# Altium integrated library LED-THP_V2.IntLib: 218 symbols
Pins are listed as number, name and electrical type; pins without a type are passive.

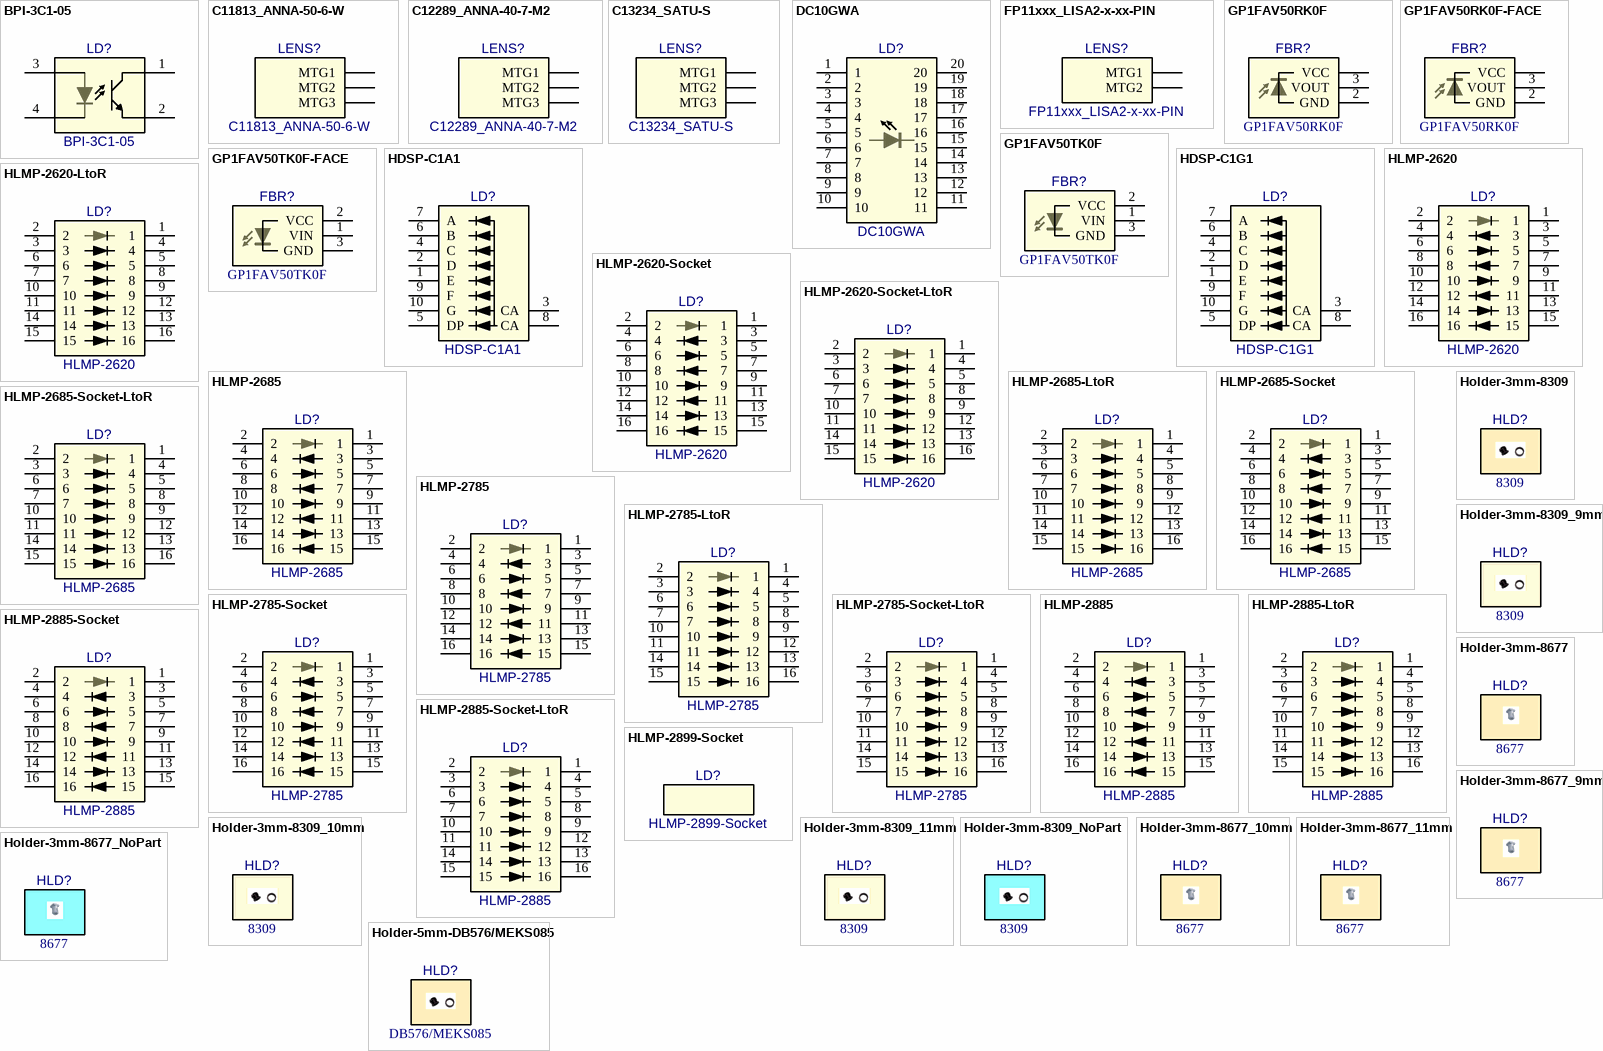
[diagram p0: symbols BPI-3C1-05 to Holder-5mm-DB576/MEKS085]

## BPI-3C1-05
designator LD?
Photo Interrupter; Manufacturer: Bright led; Part Number: BPI-3C1-05; Package: BPI-3C1-05; EDM-PN: *; SAAB PN: *; Value: BPI-3C1-05
footprint BPI-3C1-05 (New Pattern 0.0x0.0mm)
pins: 1 C, 2 E, 3 K, 4 A

## C11813_ANNA-50-6-W
designator LENS?
Led Lens Array; Manufacturer: LEDiL; Part Number: C11813_ANNA-50-6-W; Package: C11813_ANNA-50-6-W; EDM-PN: *; SAAB PN: *; Value: C11813_ANNA-50-6-W
footprint C11813_ANNA-50-6-W
pins: MTG1, MTG2, MTG3

## C12289_ANNA-40-7-M2
designator LENS?
Led Lens Array; Manufacturer: LEDiL; Part Number: C12289_ANNA-40-7-M2; Package: C12289_ANNA-40-7-M2; EDM-PN: *; SAAB PN: *; Value: C12289_ANNA-40-7-M2
footprint C12289_ANNA-40-7-M2
pins: MTG1, MTG2, MTG3

## C13234_SATU-S
designator LENS?
Led Lens Array; Manufacturer: LEDiL; Part Number: C13234_SATU-S; Package: C13234_SATU-S; EDM-PN: *; SAAB PN: *; Value: C13234_SATU-S
footprint C13234_SATU-S
pins: MTG1, MTG2, MTG3

## DC10GWA
designator LD?
LED Array 10 Segment Green; Manufacturer: Kingbright; Part Number: DC10GWA; Package: DIP-10SEG-DISPLAY; EDM-PN: *; SAAB PN: *; Value: DC10GWA
footprint DIP-10SEG-DISPLAY (DIP 10 Segment Array 10.16x24.5)
pins: 1, 2, 3, 4, 5, 6, 7, 8, 9, 10, 11, 12, 13, 14, 15, 16, 17, 18, 19, 20

## FP11xxx_LISA2-x-xx-PIN
designator LENS?
Led Lens; Manufacturer: LEDiL; Part Number: FP11xxx_LISA2-x-xx-PIN; Package: LISA2-FR11xxx; EDM-PN: *; SAAB PN: *; Value: FP11xxx_LISA2-x-xx-PIN
footprint LISA2-FR11xxx (LISA2-FR11xxx 10.0x10.0mm)
pins: 1 MTG1, 2 MTG2

## GP1FAV50RK0F
designator FBR?
Fiber Optic Receiver; Manufacturer: Sharp; Package: GP1FAV50xK0F; EDM-PN: *; Text1: *; Value: GP1FAV50RK0F; SAAB PN: *; Part Number: GP1FAV50RK0F
footprint GP1FAV50xK0F
pins: 1 VCC, 2 GND, 3 VOUT

## GP1FAV50RK0F-FACE
designator FBR?  Part Number: GP1FAV50RK0F  (hidden comment: GP1FAV50RK0F-FACE)
Fiber Optic Receiver; Manufacturer: Sharp; Package: GP1FAV50xK0F-FACE; EDM-PN: *; Text1: *; Value: GP1FAV50RK0F; SAAB PN: *
footprint GP1FAV50xK0F-FACE (GP1FAV50xK0F Face)
pins: 1 VCC, 2 GND, 3 VOUT

## GP1FAV50TK0F
designator FBR?
Fiber Optic Transmitter; Manufacturer: Sharp; Package: GP1FAV50xK0F; EDM-PN: *; Text1: *; Value: GP1FAV50TK0F; SAAB PN: *; Part Number: GP1FAV50TK0F
footprint GP1FAV50xK0F
pins: 1 VIN, 2 VCC, 3 GND

## GP1FAV50TK0F-FACE
designator FBR?  Part Number: GP1FAV50TK0F  (hidden comment: GP1FAV50TK0F-FACE)
Fiber Optic Transmitter; Manufacturer: Sharp; Package: GP1FAV50xK0F-FACE; EDM-PN: *; Text1: *; Value: GP1FAV50TK0F; SAAB PN: *
footprint GP1FAV50xK0F-FACE (GP1FAV50xK0F Face)
pins: 1 VIN, 2 VCC, 3 GND

## HDSP-C1A1
designator LD?
LED 7-Segment 1" AlGaAs Red; Manufacturer: Avago; Part Number: HDSP-C1A1; Package: HDSP-C1A1; EDM-PN: *; SAAB PN: *; Value: HDSP-C1A1
footprint HDSP-C1A1 (HDSP-C1A1 24.0x34.0mm)
pins: 1 E, 2 D, 3 CA, 4 C, 5 DP, 6 B, 7 A, 8 CA, 9 F, 10 G

## HDSP-C1G1
designator LD?
LED 7-Segment 1" Green; Manufacturer: Avago; Part Number: HDSP-C1G1; Package: HDSP-C1G1; EDM-PN: *; SAAB PN: *; Value: HDSP-C1G1
footprint HDSP-C1G1 (HDSP-C1G1 24.0x34.0mm)
pins: 1 E, 2 D, 3 CA, 4 C, 5 DP, 6 B, 7 A, 8 CA, 9 F, 10 G

## HLMP-2620
designator LD?
LED Light Bar (Red); Manufacturer: Avago; Part Number: HLMP-2620; Package: HLMP-2620; EDM-PN: *; SAAB PN: *; Value: HLMP-2620
footprint HLMP-2620 (HLMP-2620 10.16x20.32mm)
pins: 1, 2, 3, 4, 5, 6, 7, 8, 9, 10, 11, 12, 13, 14, 15, 16

## HLMP-2620-LtoR
designator LD?  value HLMP-2620  (hidden comment: HLMP-2620-LtoR)
LED Light Bar (Red); Manufacturer: Avago; Part Number: HLMP-2620; Package: HLMP-2620; EDM-PN: *; SAAB PN: *
footprint HLMP-2620 (HLMP-2620 10.16x20.32mm)
pins: 1, 2, 3, 4, 5, 6, 7, 8, 9, 10, 11, 12, 13, 14, 15, 16

## HLMP-2620-Socket
designator LD?  value HLMP-2620  (hidden comment: HLMP-2620-Socket)
LED Light Bar (Red) with 16Pin Socket; Manufacturer: Avago; Part Number: HLMP-2620; Package: HLMP-2620-SOCKET; EDM-PN: *; SAAB PN: *
footprint HLMP-2620-SOCKET (HLMP-2620 10.16x20.32mm)
pins: 1, 2, 3, 4, 5, 6, 7, 8, 9, 10, 11, 12, 13, 14, 15, 16

## HLMP-2620-Socket-LtoR
designator LD?  value HLMP-2620  (hidden comment: HLMP-2620-Socket-LtoR)
LED Light Bar (Red) with 16Pin Socket; Manufacturer: Avago; Part Number: HLMP-2620; Package: HLMP-2620-SOCKET; EDM-PN: *; SAAB PN: *
footprint HLMP-2620-SOCKET (HLMP-2620 10.16x20.32mm)
pins: 1, 2, 3, 4, 5, 6, 7, 8, 9, 10, 11, 12, 13, 14, 15, 16

## HLMP-2685
designator LD?
LED Light Bar (Red); Manufacturer: Avago; Part Number: HLMP-2685; Package: HLMP-2685; EDM-PN: *; SAAB PN: *; Value: HLMP-2685
footprint HLMP-2685 (HLMP-2685 10.16x20.32mm)
pins: 1, 2, 3, 4, 5, 6, 7, 8, 9, 10, 11, 12, 13, 14, 15, 16

## HLMP-2685-LtoR
designator LD?  value HLMP-2685  (hidden comment: HLMP-2685-LtoR)
LED Light Bar (Red); Manufacturer: Avago; Part Number: HLMP-2685; Package: HLMP-2685; EDM-PN: *; SAAB PN: *
footprint HLMP-2685 (HLMP-2685 10.16x20.32mm)
pins: 1, 2, 3, 4, 5, 6, 7, 8, 9, 10, 11, 12, 13, 14, 15, 16

## HLMP-2685-Socket
designator LD?  value HLMP-2685  (hidden comment: HLMP-2685-Socket)
LED Light Bar (Red) with 16Pin Socket; Manufacturer: Avago; Part Number: HLMP-2685; Package: HLMP-2685-SOCKET; EDM-PN: *; SAAB PN: *
footprint HLMP-2685-SOCKET (HLMP-2685 10.16x20.32mm)
pins: 1, 2, 3, 4, 5, 6, 7, 8, 9, 10, 11, 12, 13, 14, 15, 16

## HLMP-2685-Socket-LtoR
designator LD?  value HLMP-2685  (hidden comment: HLMP-2685-Socket-LtoR)
LED Light Bar (Red) with 16Pin Socket; Manufacturer: Avago; Part Number: HLMP-2685; Package: HLMP-2685-SOCKET; EDM-PN: *; SAAB PN: *
footprint HLMP-2685-SOCKET (HLMP-2685 10.16x20.32mm)
pins: 1, 2, 3, 4, 5, 6, 7, 8, 9, 10, 11, 12, 13, 14, 15, 16

## HLMP-2785
designator LD?
LED Light Bar (Yellow); Manufacturer: Avago; Part Number: HLMP-2785; Package: HLMP-2785; EDM-PN: *; SAAB PN: *; Value: HLMP-2785
footprint HLMP-2785 (HLMP-2785 10.16x20.32mm)
pins: 1, 2, 3, 4, 5, 6, 7, 8, 9, 10, 11, 12, 13, 14, 15, 16

## HLMP-2785-LtoR
designator LD?  value HLMP-2785  (hidden comment: HLMP-2785-LtoR)
LED Light Bar (Yellow); Manufacturer: Avago; Part Number: HLMP-2785; Package: HLMP-2785; EDM-PN: *; SAAB PN: *
footprint HLMP-2785 (HLMP-2785 10.16x20.32mm)
pins: 1, 2, 3, 4, 5, 6, 7, 8, 9, 10, 11, 12, 13, 14, 15, 16

## HLMP-2785-Socket
designator LD?  value HLMP-2785  (hidden comment: HLMP-2785-Socket)
LED Light Bar (Yellow) with 16Pin Socket; Manufacturer: Avago; Part Number: HLMP-2785 & Socket; Package: HLMP-2785-SOCKET; EDM-PN: *; SAAB PN: *
footprint HLMP-2785-SOCKET (HLMP-2785 10.16x20.32mm)
pins: 1, 2, 3, 4, 5, 6, 7, 8, 9, 10, 11, 12, 13, 14, 15, 16

## HLMP-2785-Socket-LtoR
designator LD?  value HLMP-2785  (hidden comment: HLMP-2785-Socket-LtoR)
LED Light Bar (Yellow) with 16Pin Socket; Manufacturer: Avago; Part Number: HLMP-2785 & Socket; Package: HLMP-2785-SOCKET; EDM-PN: *; SAAB PN: *
footprint HLMP-2785-SOCKET (HLMP-2785 10.16x20.32mm)
pins: 1, 2, 3, 4, 5, 6, 7, 8, 9, 10, 11, 12, 13, 14, 15, 16

## HLMP-2885
designator LD?
LED Light Bar (Green); Manufacturer: Avago; Part Number: HLMP-2885; Package: HLMP-2885; EDM-PN: *; SAAB PN: *; Value: HLMP-2885
footprint HLMP-2885 (HLMP-2885 10.16x20.32mm)
pins: 1, 2, 3, 4, 5, 6, 7, 8, 9, 10, 11, 12, 13, 14, 15, 16

## HLMP-2885-LtoR
designator LD?  value HLMP-2885  (hidden comment: HLMP-2885-LtoR)
LED Light Bar (Green); Manufacturer: Avago; Part Number: HLMP-2885; Package: HLMP-2885; EDM-PN: *; SAAB PN: *
footprint HLMP-2885 (HLMP-2885 10.16x20.32mm)
pins: 1, 2, 3, 4, 5, 6, 7, 8, 9, 10, 11, 12, 13, 14, 15, 16

## HLMP-2885-Socket
designator LD?  value HLMP-2885  (hidden comment: HLMP-2885-Socket)
LED Light Bar (Green) with 16Pin Socket; Manufacturer: Avago; Part Number: HLMP-2885 & Socket; Package: HLMP-2885-SOCKET; EDM-PN: *; SAAB PN: *
footprint HLMP-2885-SOCKET (HLMP-2885 10.16x20.32mm)
pins: 1, 2, 3, 4, 5, 6, 7, 8, 9, 10, 11, 12, 13, 14, 15, 16

## HLMP-2885-Socket-LtoR
designator LD?  value HLMP-2885  (hidden comment: HLMP-2885-Socket-LtoR)
LED Light Bar (Green) with 16Pin Socket; Manufacturer: Avago; Part Number: HLMP-2885 & Socket; Package: HLMP-2885-SOCKET; EDM-PN: *; SAAB PN: *
footprint HLMP-2885-SOCKET (HLMP-2885 10.16x20.32mm)
pins: 1, 2, 3, 4, 5, 6, 7, 8, 9, 10, 11, 12, 13, 14, 15, 16

## HLMP-2899-Socket
designator LD?
LED Light Bar Bezel (HLMP-2x85); Manufacturer: Agilent; Part Number: HLMP-2899; Package: HLMP-2899-Socket; EDM-PN: *; SAAB PN: *; Value: HLMP-2899-Socket
footprint HLMP-2899-SOCKET (HLMP-2899 23.88x3.72mm)

## Holder-3mm-8309
designator HLD?, comment 8309
Led Holder Clip-in 3mm; Manufacturer: Keystone; Package: HOLDER-3MM-8309; EDM-PN: *; Text1: *; Value: 8309; SAAB PN: *; Part Number: 8309
footprint HOLDER-3MM-8309 (8309 5.9x5.9mm)

## Holder-3mm-8309_9mm
designator HLD?, comment 8309
Led Holder Clip-in 3mm; Manufacturer: Keystone; Package: HOLDER-3MM-8309-9mm; EDM-PN: *; Text1: *; Value: 8309; SAAB PN: *; Part Number: 8309
footprint HOLDER-3MM-8309-9mm (8309 5.9x5.9mm)

## Holder-3mm-8309_10mm
designator HLD?, comment 8309
Led Holder Clip-in 3mm; Manufacturer: Keystone; Package: HOLDER-3MM-8309-10mm; EDM-PN: *; Text1: *; Value: 8309; SAAB PN: *; Part Number: 8309
footprint HOLDER-3MM-8309-10mm (8309 5.9x5.9mm)

## Holder-3mm-8309_11mm
designator HLD?, comment 8309
Led Holder Clip-in 3mm; Manufacturer: Keystone; Package: HOLDER-3MM-8309-11mm; EDM-PN: *; Text1: *; Value: 8309; SAAB PN: *; Part Number: 8309
footprint HOLDER-3MM-8309-11mm (8309 5.9x5.9mm)

## Holder-3mm-8309_NoPart
designator HLD?, comment 8309  (mechanical)
Led Holder Clip-in 3mm; Manufacturer: Keystone; Package: NA; EDM-PN: *; Text1: *; Value: 8309; SAAB PN: *; Part Number: 8309

## Holder-3mm-8677
designator HLD?, comment 8677
Led Lens Cap Clip-in 3mm; Manufacturer: Keystone; EDM-PN: MEC381; Package: HOLDER-3MM-8677; Text1: *; Value: 8677; SAAB PN: *; Part Number: 8677
footprint HOLDER-3MM-8677 (8677 4.8x4.8mm)

## Holder-3mm-8677_9mm
designator HLD?, comment 8677
Led Lens Cap Clip-in 3mm; Manufacturer: Keystone; EDM-PN: MEC381; Package: HOLDER-3MM-8677-9mm; Text1: *; Value: 8677; SAAB PN: *; Part Number: 8677
footprint HOLDER-3MM-8677-9mm (8677 4.8x4.8mm)

## Holder-3mm-8677_10mm
designator HLD?, comment 8677
Led Lens Cap Clip-in 3mm; Manufacturer: Keystone; EDM-PN: MEC381; Package: HOLDER-3MM-8677-10mm; Text1: *; Value: 8677; SAAB PN: *; Part Number: 8677
footprint HOLDER-3MM-8677-10mm (8677 4.8x4.8mm)

## Holder-3mm-8677_11mm
designator HLD?, comment 8677
Led Lens Cap Clip-in 3mm; Manufacturer: Keystone; EDM-PN: MEC381; Package: HOLDER-3MM-8677-11mm; Text1: *; Value: 8677; SAAB PN: *; Part Number: 8677
footprint HOLDER-3MM-8677-11mm (8677 4.8x4.8mm)

## Holder-3mm-8677_NoPart
designator HLD?, comment 8677  (mechanical)
Led Lens Cap Clip-in 3mm; Manufacturer: Keystone; EDM-PN: MEC381; Package: NA; Text1: *; Value: 8677; SAAB PN: *; Part Number: 8677

## Holder-5mm-DB576/MEKS085
designator HLD?, comment DB576/MEKS085
Led Holder Clip-in 5mm; Manufacturer: Ele123; EDM-PN: HLD19; Package: HOLDER-5MM-DB576/MEKS085; Text1: *; Value: DB576/MEKS085; SAAB PN: *; Part Number: DB576/MEKS085
footprint HOLDER-5MM-DB576/MEKS085 (DB576/MEKS085 7.6x7.6mm)

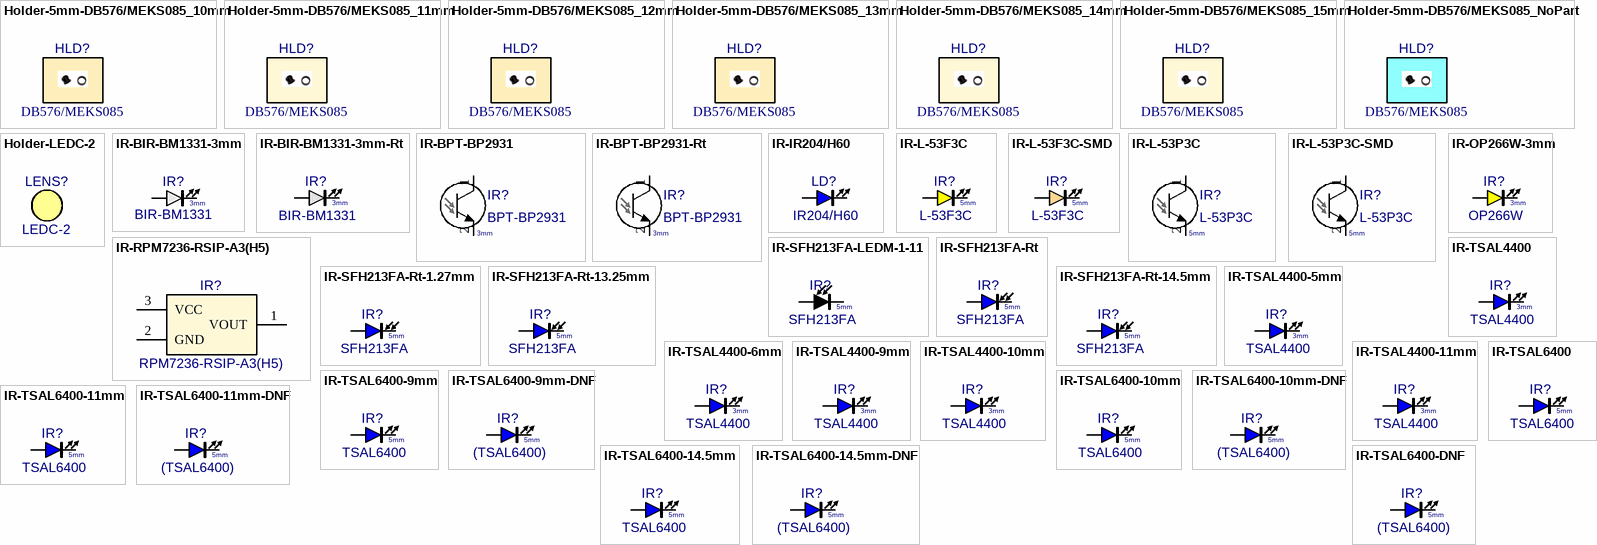
[diagram p1: symbols Holder-5mm-DB576/MEKS085_10mm to IR-TSAL6400-DNF]

## Holder-5mm-DB576/MEKS085_10mm
designator HLD?, comment DB576/MEKS085
Led Holder Clip-in 5mm; Manufacturer: Ele123; EDM-PN: HLD19; Package: HOLDER-5MM-DB576/MEKS085-10MM; Text1: *; Value: DB576/MEKS085; SAAB PN: *; Part Number: DB576/MEKS085
footprint HOLDER-5MM-DB576/MEKS085-10MM (DB576/MEKS085 7.6x7.6mm)

## Holder-5mm-DB576/MEKS085_11mm
designator HLD?, comment DB576/MEKS085
Led Holder Clip-in 5mm; Manufacturer: Ele123; EDM-PN: HLD19; Package: HOLDER-5MM-DB576/MEKS085-11MM; Text1: *; Value: DB576/MEKS085; SAAB PN: *; Part Number: DB576/MEKS085
footprint HOLDER-5MM-DB576/MEKS085-11MM (DB576/MEKS085 7.6x7.6mm)

## Holder-5mm-DB576/MEKS085_12mm
designator HLD?, comment DB576/MEKS085
Led Holder Clip-in 5mm; Manufacturer: Ele123; EDM-PN: HLD19; Package: HOLDER-5MM-DB576/MEKS085-12MM; Text1: *; Value: DB576/MEKS085; SAAB PN: *; Part Number: DB576/MEKS085
footprint HOLDER-5MM-DB576/MEKS085-12MM (DB576/MEKS085 7.6x7.6mm)

## Holder-5mm-DB576/MEKS085_13mm
designator HLD?, comment DB576/MEKS085
Led Holder Clip-in 5mm; Manufacturer: Ele123; EDM-PN: HLD19; Package: HOLDER-5MM-DB576/MEKS085-13MM; Text1: *; Value: DB576/MEKS085; SAAB PN: *; Part Number: DB576/MEKS085
footprint HOLDER-5MM-DB576/MEKS085-13MM (DB576/MEKS085 7.6x7.6mm)

## Holder-5mm-DB576/MEKS085_14mm
designator HLD?, comment DB576/MEKS085
Led Holder Clip-in 5mm; Manufacturer: Ele123; EDM-PN: HLD19; Package: HOLDER-5MM-DB576/MEKS085-14MM; Text1: *; Value: DB576/MEKS085; SAAB PN: *; Part Number: DB576/MEKS085
footprint HOLDER-5MM-DB576/MEKS085-14MM (DB576/MEKS085 7.6x7.6mm)

## Holder-5mm-DB576/MEKS085_15mm
designator HLD?, comment DB576/MEKS085
Led Holder Clip-in 5mm; Manufacturer: Ele123; EDM-PN: HLD19; Package: HOLDER-5MM-DB576/MEKS085-15MM; Text1: *; Value: DB576/MEKS085; SAAB PN: *; Part Number: DB576/MEKS085
footprint HOLDER-5MM-DB576/MEKS085-15MM (DB576/MEKS085 7.6x7.6mm)

## Holder-5mm-DB576/MEKS085_NoPart
designator HLD?, comment DB576/MEKS085  (mechanical)
Led Holder Clip-in 5mm; Manufacturer: Ele123; EDM-PN: HLD19; Package: NA; Text1: *; Value: DB576/MEKS085; SAAB PN: *; Part Number: DB576/MEKS085

## Holder-LEDC-2
designator LENS?, comment LEDC-2
Led Lens Holder (5mm); Manufacturer: Essentra; Part Number: LEDC-2; Package: HOLDER-LEDC-2; EDM-PN: *; SAAB PN: *; Value: LEDC-2
footprint HOLDER-LEDC-2 (LEDC-2 11.0x11.0mm)

## IR-BIR-BM1331-3mm
designator IR?  value BIR-BM1331  Text1: 3mm  (hidden comment: IR-BIR-BM1331-3mm)
IR Emitting Diode 3mm; Manufacturer: Bright Led Electronics; Part Number: BIR-BM1331; Package: LED-3mm-Clear; EDM-PN: *; SAAB PN: *
footprint LED-3mm-Clear (LED 3mm 4.0x4.0mm Clear)
pins: 1 K, 2 A

## IR-BIR-BM1331-3mm-Rt
designator IR?, comment value BIR-BM1331  Text1: 3mm  (hidden comment: IR-BIR-BM1331-3mm)
IR Emitting Diode 3mm; Manufacturer: Bright Led Electronics; Part Number: BIR-BM1331; Package: LED-3mm-Clear-Rt; EDM-PN: *; SAAB PN: *
footprint LED-3mm-Clear-Rt (LED 3mm R Angle 4.0x4.0mm Clear)
pins: 1 K, 2 A

## IR-BPT-BP2931
designator IR?  value BPT-BP2931  Text1: 3mm  (hidden comment: IR-BPT-BP2931)
IR Phototransistor 3mm; Manufacturer: Bright Led Electronics; Part Number: BPT-BP2931; Package: LED-3mm-Black; EDM-PN: *; SAAB PN: *
footprint LED-3mm-Black (LED 3mm 4.0x4.0mm Black)
pins: 1 K, 2 A

## IR-BPT-BP2931-Rt
designator IR?  value BPT-BP2931  Text1: 3mm  (hidden comment: IR-BPT-BP2931-Rt)
IR Phototransistor 3mm; Manufacturer: Bright Led Electronics; Part Number: BPT-BP2931; Package: LED-3mm-Black-Rt; EDM-PN: *; SAAB PN: *
footprint LED-3mm-Black-Rt (LED 3mm R Angle 4.0x4.0mm Black)
pins: 1 K, 2 A

## IR-IR204/H60
designator LD?, comment IR204/H60
IR Emitting Diode 3mm; Manufacturer: Everlight; Part Number: IR204/H60; Package: LED-3mm-Blue; EDM-PN: *; Text1: *; SAAB PN: *; Value: IR204/H60
footprint LED-3mm-Blue (LED 3mm 4.0x4.0mm Blue)
pins: 1 K, 2 A

## IR-L-53F3C
designator IR?  value L-53F3C  Text1: 5mm  (hidden comment: IR-L-53F3C)
IR Emitting Diode 5mm; Manufacturer: Kingbright; Part Number: L-53F3C; Package: LED-5mm-Yellow; EDM-PN: *; SAAB PN: *
footprint LED-5mm-Yellow (LED 5mm 5.9x5.5mm)
pins: 1 K, 2 A

## IR-L-53F3C-SMD
designator IR?  value L-53F3C  Text1: 5mm  (hidden comment: IR-L-53F3C-SMD)
IR Emitting Diode 5mm; Manufacturer: Kingbright; Part Number: L-53F3C; Package: LED-5mm-Orange-SMD; EDM-PN: *; SAAB PN: *
footprint LED-5mm-Orange-SMD (LED 5mm 5.9x5.5mm)
pins: 1 K, 2 A

## IR-L-53P3C
designator IR?  value L-53P3C  Text1: 5mm  (hidden comment: IR-L-53P3C)
IR Phototransistor 5mm; Manufacturer: Kingbright; Part Number: L-53P3C; Package: LED-5mm-Yellow; EDM-PN: *; SAAB PN: *
footprint LED-5mm-Yellow (LED 5mm 5.9x5.5mm)
pins: 1 K, 2 A

## IR-L-53P3C-SMD
designator IR?  value L-53P3C  Text1: 5mm  (hidden comment: IR-L-53P3C-SMD)
IR Phototransistor 5mm; Manufacturer: Kingbright; Part Number: L-53P3C; Package: LED-5mm-Orange-SMD; EDM-PN: *; SAAB PN: *
footprint LED-5mm-Orange-SMD (LED 5mm 5.9x5.5mm)
pins: 1 K, 2 A

## IR-OP266W-3mm
designator IR?  value OP266W  Text1: 3mm  (hidden comment: IR-OP266W-3mm)
IR Emitting Diode 3mm; Manufacturer: TT Electronics; Part Number: OP266W; Package: LED-3mm-Yellow; EDM-PN: *; SAAB PN: *
footprint LED-3mm-Yellow (LED 3mm 4.0x4.0mm Yellow)
pins: 1 K, 2 A

## IR-RPM7236-RSIP-A3(H5)
designator IR?  value RPM7236-RSIP-A3(H5)  (hidden comment: IR-RPM7236-RSIP-A3(H5))
IR Receiver Module; Manufacturer: Rohm; Part Number: RPM7236-RSIP-A3(H5); Package: RSIP-A3(H5); EDM-PN: *; Text1: *; SAAB PN: *
footprint RSIP-A3(H5)
pins: 1 VOUT, 2 GND (power), 3 VCC (power)

## IR-SFH213FA-LEDM-1-11
designator IR?, comment value SFH213FA  Text1: 5mm  (hidden comment: SFH213FA-LEDM-1-11)
IR Photodiode and Spacer; Manufacturer: Osram/Essentra; Part Number: SFH213FA/LEDM-1-11; Package: LED-5mm-Blue-LEDM-1-11; EDM-PN: *; SAAB PN: *
footprint LED-5mm-Blue-LEDM-1-11 (LED 5mm 5.9x5.5mm)
pins: 1 K, 2 A

## IR-SFH213FA-Rt
designator IR?, comment Text1: 5mm  (hidden comment: SFH213FA)
IR Photodiode; Manufacturer: Osram; Part Number: SFH213FA; Package: LED-5mm-Blue-Rt; EDM-PN: *; SAAB PN: *; Value: SFH213FA
footprint LED-5mm-BLUE-Rt (LED 5mm BLUE Rt Angle)
pins: 1 K, 2 A

## IR-SFH213FA-Rt-1.27mm
designator IR?, comment value SFH213FA  Text1: 5mm  (hidden comment: SFH213FA-1.27mm)
IR Photodiode; Manufacturer: Osram; Part Number: SFH213FA; Package: LED-5mm-Blue-Rt-1.27mm; EDM-PN: *; SAAB PN: *
footprint LED-5mm-BLUE-Rt-1.27mm (LED 5mm Blue Rt - Centre 1.27mm From PCB)
pins: 1 K, 2 A

## IR-SFH213FA-Rt-13.25mm
designator IR?, comment value SFH213FA  Text1: 5mm  (hidden comment: SFH213FA-13.25mm)
IR Photodiode; Manufacturer: Osram; Part Number: SFH213FA; Package: LED-5mm-Blue-Rt-13.25mm; EDM-PN: *; SAAB PN: *
footprint LED-5mm-BLUE-Rt-13.25mm (LED 5mm Blue Rt - Centre 13.25mm From PCB)
pins: 1 K, 2 A

## IR-SFH213FA-Rt-14.5mm
designator IR?, comment value SFH213FA  Text1: 5mm  (hidden comment: SFH213FA-14.5mm)
IR Photodiode; Manufacturer: Osram; Part Number: SFH213FA; Package: LED-5mm-Blue-Rt-14.5mm; EDM-PN: *; SAAB PN: *
footprint LED-5mm-BLUE-Rt-14.5mm (LED 5mm Blue Rt - Centre 14.5mm From PCB)
pins: 1 K, 2 A

## IR-TSAL4400
designator IR?, comment Text1: 3mm  (hidden comment: TSAL4400)
IR Emitting Diode 940nm 50Deg.; Manufacturer: Vishay; EDM-PN: LED234; Part Number: TSAL4400; Package: LED-3mm-Blue; SAAB PN: *; Value: TSAL4400
footprint LED-3mm-Blue (LED 3mm 4.0x4.0mm Blue)
pins: 1 K, 2 A

## IR-TSAL4400-5mm
designator IR?, comment value TSAL4400  Text1: 3mm  (hidden comment: TSAL4400/705820050)
IR Emitting Diode 940nm 50Deg. and Spacer; Manufacturer: Vishay/Wurth; EDM-PN: LED234/MEC380; Part Number: TSAL4400/705820050; Package: LED-3mm-Blue-5mm; SAAB PN: *
footprint LED-3mm-Blue-5mm (LED 3mm 4.0x4.0mm Blue)
pins: 1 K, 2 A

## IR-TSAL4400-6mm
designator IR?, comment value TSAL4400  Text1: 3mm  (hidden comment: TSAL4400/705820060)
IR Emitting Diode 940nm 50Deg. and Spacer; Manufacturer: Vishay/Wurth; EDM-PN: LED234/MEC?; Part Number: TSAL4400/705820060; Package: LED-3mm-Blue-6mm; SAAB PN: *
footprint LED-3mm-Blue-6mm (LED 3mm 4.0x4.0mm Blue)
pins: 1 K, 2 A

## IR-TSAL4400-9mm
designator IR?, comment value TSAL4400  Text1: 3mm  (hidden comment: TSAL4400/705820090)
IR Emitting Diode 940nm 50Deg. and Spacer; Manufacturer: Vishay/Wurth; EDM-PN: LED234/MEC338; Part Number: TSAL4400/705820090; Package: LED-3mm-Blue-9mm; SAAB PN: *
footprint LED-3mm-Blue-9mm (LED 3mm 4.0x4.0mm Blue)
pins: 1 K, 2 A

## IR-TSAL4400-10mm
designator IR?, comment value TSAL4400  Text1: 3mm  (hidden comment: TSAL4400/705820100)
IR Emitting Diode 940nm 50Deg. and Spacer; Manufacturer: Vishay/Wurth; EDM-PN: LED234/MEC363; Part Number: TSAL4400/705820100; Package: LED-3mm-Blue-10mm; SAAB PN: *
footprint LED-3mm-Blue-10mm (LED 3mm 4.0x4.0mm Blue)
pins: 1 K, 2 A

## IR-TSAL4400-11mm
designator IR?, comment value TSAL4400  Text1: 3mm  (hidden comment: TSAL4400/705820110)
IR Emitting Diode 940nm 50Deg. and Spacer; Manufacturer: Vishay/Wurth; EDM-PN: LED234/MEC362; Part Number: TSAL4400/705820110; Package: LED-3mm-Blue-11mm; SAAB PN: *
footprint LED-3mm-Blue-11mm (LED 3mm 4.0x4.0mm Blue)
pins: 1 K, 2 A

## IR-TSAL6400
designator IR?, comment Text1: 5mm  (hidden comment: TSAL6400)
IR Emitting Diode 940nm 50Deg.; Manufacturer: Vishay; EDM-PN: LED187; Part Number: TSAL6400; Package: LED-5mm-Blue; SAAB PN: *; Value: TSAL6400
footprint LED-5mm-Blue (LED 5mm 5.9x5.5mm)
pins: 1 K, 2 A

## IR-TSAL6400-9mm
designator IR?, comment value TSAL6400  Text1: 5mm  (hidden comment: TSAL6400/705820090)
IR Emitting Diode 940nm 50Deg. and Spacer; Manufacturer: Vishay/Wurth; EDM-PN: LED187/MEC338; Part Number: TSAL6400/705820090; Package: LED-5mm-Blue-9MM; SAAB PN: *
footprint LED-5mm-Blue-9MM (LED 5mm 5.9x5.5mm)
pins: 1 K, 2 A

## IR-TSAL6400-9mm-DNF
designator IR?, comment value (TSAL6400)  Text1: 5mm  (hidden comment: TSAL6400/705820090)
IR Emitting Diode 940nm 50Deg. and Spacer - Do not Fit; Manufacturer: Vishay/Wurth; Part Number: DNF - TSAL6400/705820090; EDM-PN: LED187/MEC338; Package: LED-5mm-Blue-9MM; SAAB PN: *
footprint LED-5mm-Blue-9MM (LED 5mm 5.9x5.5mm)
pins: 1 K, 2 A

## IR-TSAL6400-10mm
designator IR?, comment value TSAL6400  Text1: 5mm  (hidden comment: TSAL6400/705820100)
IR Emitting Diode 940nm 50Deg. and Spacer; Manufacturer: Vishay/Wurth; EDM-PN: LED187/MEC363; Part Number: TSAL6400/705820100; Package: LED-5mm-Blue-10MM; SAAB PN: *
footprint LED-5mm-Blue-10MM (LED 5mm 5.9x5.5mm)
pins: 1 K, 2 A

## IR-TSAL6400-10mm-DNF
designator IR?, comment value (TSAL6400)  Text1: 5mm  (hidden comment: TSAL6400/705820100)
IR Emitting Diode 940nm 50Deg. and Spacer - Do not Fit; Manufacturer: Vishay/Wurth; Part Number: DNF - TSAL6400/705820100; EDM-PN: LED187/MEC363; Package: LED-5mm-Blue-10MM; SAAB PN: *
footprint LED-5mm-Blue-10MM (LED 5mm 5.9x5.5mm)
pins: 1 K, 2 A

## IR-TSAL6400-11mm
designator IR?, comment value TSAL6400  Text1: 5mm  (hidden comment: TSAL6400/705820110)
IR Emitting Diode 940nm 50Deg. and Spacer; Manufacturer: Vishay/Wurth; EDM-PN: LED187/MEC362; Part Number: TSAL6400/705820110; Package: LED-5mm-Blue-11MM; SAAB PN: *
footprint LED-5mm-Blue-11MM (LED 5mm 5.9x5.5mm)
pins: 1 K, 2 A

## IR-TSAL6400-11mm-DNF
designator IR?, comment value (TSAL6400)  Text1: 5mm  (hidden comment: TSAL6400/705820110)
IR Emitting Diode 940nm 50Deg. and Spacer - Do not Fit; Manufacturer: Vishay/Wurth; Part Number: DNF - TSAL6400/705820110; EDM-PN: LED187/MEC362; Package: LED-5mm-Blue-11MM; SAAB PN: *
footprint LED-5mm-Blue-11MM (LED 5mm 5.9x5.5mm)
pins: 1 K, 2 A

## IR-TSAL6400-14.5mm
designator IR?, comment value TSAL6400  Text1: 5mm  (hidden comment: TSAL6400/705820145)
IR Emitting Diode 940nm 50Deg. and Spacer; Manufacturer: Vishay/Wurth; EDM-PN: LED187/MEC367; Part Number: TSAL6400/705820145; Package: LED-5mm-Blue-14.5MM; SAAB PN: *
footprint LED-5mm-Blue-14.5MM (LED 5mm 5.9x5.5mm)
pins: 1 K, 2 A

## IR-TSAL6400-14.5mm-DNF
designator IR?, comment value (TSAL6400)  Text1: 5mm  (hidden comment: TSAL6400/705820145)
IR Emitting Diode 940nm 50Deg. and Spacer - Do not Fit; Manufacturer: Vishay/Wurth; Part Number: DNF - TSAL6400/705820145; EDM-PN: LED187/MEC367; Package: LED-5mm-Blue-14.5MM; SAAB PN: *
footprint LED-5mm-Blue-14.5MM (LED 5mm 5.9x5.5mm)
pins: 1 K, 2 A

## IR-TSAL6400-DNF
designator IR?, comment value (TSAL6400)  Text1: 5mm  (hidden comment: TSAL6400)
IR Emitting Diode 940nm 50Deg. - Do not Fit; Manufacturer: Vishay; Part Number: DNF - TSAL6400; EDM-PN: LED187; Package: LED-5mm-Blue; SAAB PN: *
footprint LED-5mm-Blue (LED 5mm 5.9x5.5mm)
pins: 1 K, 2 A

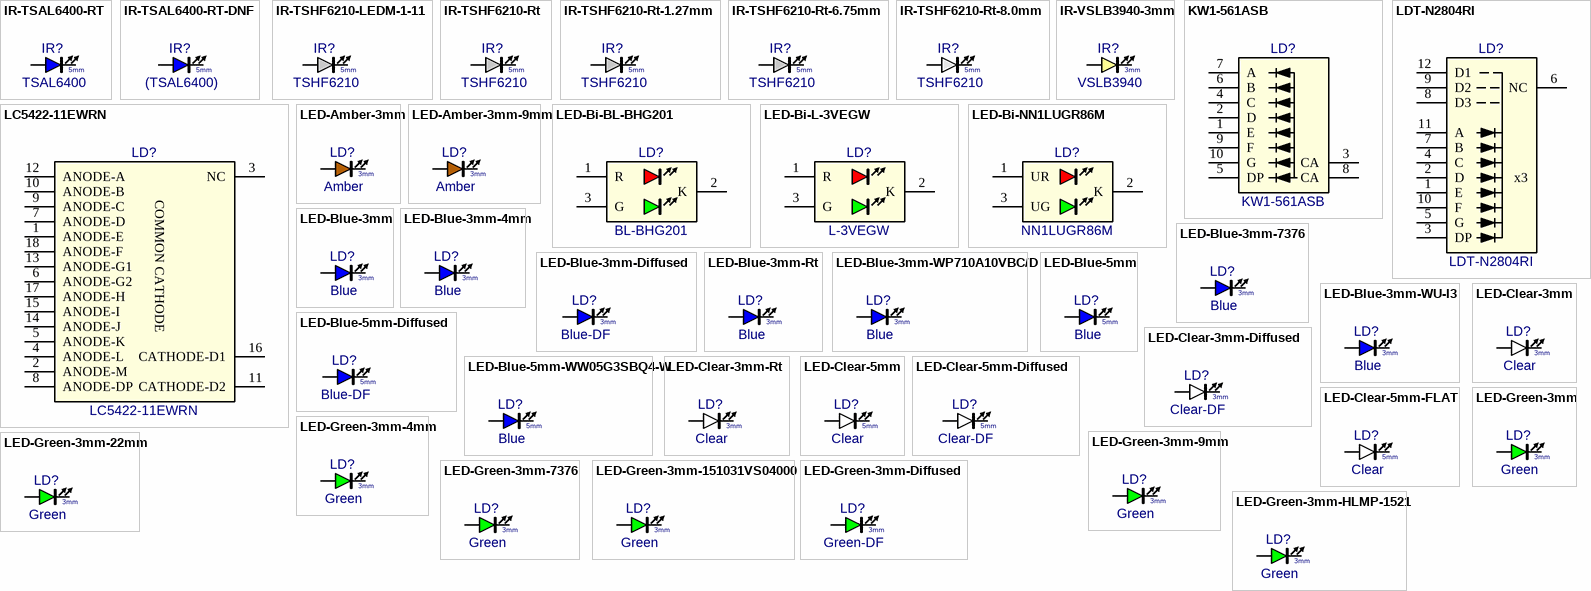
[diagram p2: symbols IR-TSAL6400-RT to LED-Green-3mm-HLMP-1521]

## IR-TSAL6400-RT
designator IR?, comment Text1: 5mm  (hidden comment: TSAL6400)
IR Emitting Diode 940nm 50Deg.; Manufacturer: Vishay; EDM-PN: LED187; Part Number: TSAL6400; Package: LED-5mm-Blue-RT; SAAB PN: *; Value: TSAL6400
footprint LED-5mm-Blue-RT (LED 5mm BLUE Rt Angle)
pins: 1 K, 2 A

## IR-TSAL6400-RT-DNF
designator IR?, comment value (TSAL6400)  Text1: 5mm  (hidden comment: TSAL6400)
IR Emitting Diode 940nm 50Deg. - Do not Fit; Manufacturer: Vishay; Part Number: DNF - TSAL6400; EDM-PN: LED187; Package: LED-5mm-Blue-RT; SAAB PN: *
footprint LED-5mm-Blue-RT (LED 5mm BLUE Rt Angle)
pins: 1 K, 2 A

## IR-TSHF6210-LEDM-1-11
designator IR?, comment value TSHF6210  Text1: 5mm  (hidden comment: TSHF6210-LEDM-1-11)
IR Emitting Diode and Spacer; Manufacturer: Vishay/Essentra; Part Number: TSHF6210/LEDM-1-11; Package: LED-5mm-White-LEDM-1-11; EDM-PN: *; SAAB PN: *
footprint LED-5mm-White-LEDM-1-11 (LED 5mm 5.9x5.5mm)
pins: 1 K, 2 A

## IR-TSHF6210-Rt
designator IR?, comment value TSHF6210  Text1: 5mm  (hidden comment: TSHF6210-RT)
IR Emitting Diode; Manufacturer: Vishay; Part Number: TSHF6210; Package: LED-5mm-White-RT; EDM-PN: *; SAAB PN: *
footprint LED-5mm-WHITE-Rt (LED 5mm White Rt)
pins: 1 K, 2 A

## IR-TSHF6210-Rt-1.27mm
designator IR?, comment value TSHF6210  Text1: 5mm  (hidden comment: TSHF6210-RT-1.27mm)
IR Emitting Diode; Manufacturer: Vishay; Part Number: TSHF6210; Package: LED-5mm-White-RT-1.27mm; EDM-PN: *; SAAB PN: *
footprint LED-5mm-WHITE-Rt-1.27mm (LED 5mm White Rt - Centre 1.27mm From PCB)
pins: 1 K, 2 A

## IR-TSHF6210-Rt-6.75mm
designator IR?, comment value TSHF6210  Text1: 5mm  (hidden comment: TSHF6210-RT-6.75mm)
IR Emitting Diode; Manufacturer: Vishay; Part Number: TSHF6210; Package: LED-5mm-White-RT-6.75mm; EDM-PN: *; SAAB PN: *
footprint LED-5mm-WHITE-Rt-6.75mm (LED 5mm White Rt - Centre 6.75mm From PCB)
pins: 1 K, 2 A

## IR-TSHF6210-Rt-8.0mm
designator IR?, comment value TSHF6210  Text1: 5mm  (hidden comment: TSHF6210-RT-8.0mm)
IR Emitting Diode; Manufacturer: Vishay; Part Number: TSHF6210; Package: LED-5mm-White-RT-8.0mm; EDM-PN: *; SAAB PN: *
footprint LED-5mm-WHITE-Rt-8.0mm (LED 5mm White Rt - Centre 8.0mm From PCB)
pins: 1 K, 2 A

## IR-VSLB3940-3mm
designator IR?  value VSLB3940  Text1: 3mm  (hidden comment: IR-VSLB3940-3mm)
IR Emitting Diode 3mm; Manufacturer: Vishay; Part Number: VSLB3940; Package: LED-3mm-Yellow; EDM-PN: *; SAAB PN: *
footprint LED-3mm-Yellow (LED 3mm 4.0x4.0mm Yellow)
pins: 1 K, 2 A

## KW1-561ASB
designator LD?
LED 7-Segment 56" Black/White; Manufacturer: Lucky Light; Part Number: KW1-561ASB; Package: KW1-561ASB; EDM-PN: *; SAAB PN: *; Value: KW1-561ASB
footprint KW1-561ASB (KW1-561ASB 12.7x19.05mm)
pins: 1 E, 2 D, 3 CA, 4 C, 5 DP, 6 B, 7 A, 8 CA, 9 F, 10 G

## LC5422-11EWRN
designator LD?
LED Alphanumeric Display 0.54" Dual; Manufacturer: Ledtech; Part Number: LC5422-11EWRN; Package: LC5422-11EWRN; EDM-PN: *; SAAB PN: *; Value: LC5422-11EWRN
footprint LC5422-11EWRN (New Pattern 25.2x21.2mm)
pins: 1 ANODE-E, 2 ANODE-M, 3 NC, 4 ANODE-L, 5 ANODE-K, 6 ANODE-G2, 7 ANODE-D, 8 ANODE-DP, 9 ANODE-C, 10 ANODE-B, 11 CATHODE-D2, 12 ANODE-A, 13 ANODE-G1, 14 ANODE-J, 15 ANODE-I, 16 CATHODE-D1, 17 ANODE-H, 18 ANODE-F
text: COMMON CATHODE

## LDT-N2804RI
designator LD?
LED 7-Segment 7mm Red; Manufacturer: Lumex; Part Number: LDT-N2804RI; Package: LDT-N2804RI-Red; EDM-PN: *; SAAB PN: *; Value: LDT-N2804RI
footprint LDT-N2804RI-Red (LDT-N2804RI 22.53x10.0mm)
pins: 1 E, 2 D, 3 DP, 4 C, 5 G, 6 NC, 7 B, 8 D3, 9 D2, 10 F, 11 A, 12 D1
text: x3

## LED-Amber-3mm
designator LD?  value Amber  Text1: 3mm  (hidden comment: LED-Amber-3mm)
LED Amber 3mm; Manufacturer: Various; Part Number: LED Amber 3mm; Package: LED-3mm-Amber; EDM-PN: *; SAAB PN: *
footprint LED-3mm-AMBER (LED 3mm 4.0x4.0mm Amber)
pins: 1 K, 2 A

## LED-Amber-3mm-9mm
designator LD?  value Amber  Text1: 3mm  (hidden comment: LED-Amber-3mm-9mm)
LED Amber 3mm; Manufacturer: Various; Part Number: LED Amber 3mm; Package: LED-3mm-Amber-9mm; EDM-PN: *; SAAB PN: *
footprint LED-3mm-AMBER-9MM (LED 3mm 4.0x4.0mm Amber)
pins: 1 K, 2 A

## LED-Bi-BL-BHG201
designator LD?, comment value BL-BHG201  (hidden comment: LED3mm-Bi-Colour-BL-BHG201)
LED Bi Colour 3mm Red/Green; Manufacturer: Bright Led Elec.; Part Number: BL-BHG201; Package: LED-3MM-BI; EDM-PN: *; SAAB PN: *
footprint LED-3mm-BI (LED 3mm 4.0x4.0mm BI)
pins: 1 R, 2 K, 3 G

## LED-Bi-L-3VEGW
designator LD?, comment value L-3VEGW  (hidden comment: LED3mm-Bi-Colour-L-3VEGW)
LED Bi Colour 3mm; Manufacturer: Kingbright; Part Number: L-3VEGW; Package: LED3MM-BI; EDM-PN: *; SAAB PN: *
footprint LED-3mm-BI (LED 3mm 4.0x4.0mm BI)
pins: 1 R, 2 K, 3 G

## LED-Bi-NN1LUGR86M
designator LD?, comment value NN1LUGR86M  (hidden comment: LED3mm-Bi-Colour-NN1LUGR86M)
LED Bi Colour 3mm T-1 Rt Angle; Manufacturer: SunLED; Part Number: NN1LUGR86M; Package: LED3MM-BI-Rt; EDM-PN: *; SAAB PN: *
footprint LED-3mm-BI-Rt (LED 3mm 6.35x7.0mm BI Rt Angle)
pins: 1 UR, 2 K, 3 UG

## LED-Blue-3mm
designator LD?  value Blue  Text1: 3mm  (hidden comment: LED-Blue-3mm)
LED Blue 3mm; Manufacturer: Various; EDM-PN: LED82; Part Number: LED Blue 3mm; Package: LED-3mm-Blue; SAAB PN: *
footprint LED-3mm-Blue (LED 3mm 4.0x4.0mm Blue)
pins: 1 K, 2 A

## LED-Blue-3mm-4mm
designator LD?  value Blue  Text1: 3mm  (hidden comment: LED-Blue-3mm-4mm)
LED Blue 3mm - 4mm Space; Manufacturer: Various; EDM-PN: LED82; Part Number: LED Blue 3mm; Package: LED-3mm-Blue-4mm; SAAB PN: *
footprint LED-3mm-Blue-4mm (LED 3mm 4.0x4.0mm Blue)
pins: 1 K, 2 A

## LED-Blue-3mm-7376
designator LD?  value Blue  Text1: 3mm  (hidden comment: LED-Blue-3mm-7376)
LED Blue 3mm and Spacer; Manufacturer: Various/Keystone; Part Number: LED Blue 3mm/7376; EDM-PN: LED82; Package: LED-3mm-Blue-7376; Reutech PN: *; SAAB PN: *
footprint LED-3mm-Blue-7376 (LED 3mm 4.0x4.0mm Blue)
pins: 1 K, 2 A

## LED-Blue-3mm-Diffused
designator LD?  value Blue-DF  Text1: 3mm  (hidden comment: LED-Blue-3mm-Diffused)
LED Blue 3mm - Diffused; Manufacturer: Various; Part Number: LED Blue 3mm Diffused; Package: LED-3mm-Blue; EDM-PN: *; SAAB PN: *
footprint LED-3mm-Blue (LED 3mm 4.0x4.0mm Blue)
pins: 1 K, 2 A

## LED-Blue-3mm-Rt
designator LD?  value Blue  Text1: 3mm  (hidden comment: LED-Blue-3mm-Rt)
LED Blue 3mm Rt Angle; Manufacturer: Various; EDM-PN: LED82; Part Number: LED Blue 3mm; Package: LED-3mm-Blue-RT; SAAB PN: *
footprint LED-3mm-Blue-Rt (LED 3mm R Angle 4.0x4.0mm Blue)
pins: 1 K, 2 A

## LED-Blue-3mm-WP710A10VBC/D
designator LD?, comment value Blue  Text1: 3mm  (hidden comment: WP710A10VBC/D)
LED Blue 3mm; Manufacturer: Kingbright; Part Number: WP710A10VBC/D; Package: LED-3mm-Blue; EDM-PN: *; SAAB PN: *
footprint LED-3mm-Blue (LED 3mm 4.0x4.0mm Blue)
pins: 1 K, 2 A

## LED-Blue-3mm-WU-I3
designator LD?  value Blue  Text1: 3mm  (hidden comment: LED-Blue-3mm-WU-I3)
LED Blue 3mm and WU-I3 Holder; Manufacturer: Various/Commuica; Part Number: LED Blue 3mm/WU-I3; Package: LED-3mm-Blue-WU-I3; EDM-PN: *; SAAB PN: *
footprint LED-3mm-Blue-WU-I3 (LED 3mm WU-I3 8.0x8.0mm Blue)
pins: 1 K, 2 A

## LED-Blue-5mm
designator LD?  value Blue  Text1: 5mm  (hidden comment: LED-Blue-5mm)
LED Blue 5mm; Manufacturer: Various; Part Number: LED Blue 5mm; Package: LED-5mm-Blue; EDM-PN: *; SAAB PN: *
footprint LED-5mm-Blue (LED 5mm 5.9x5.5mm)
pins: 1 K, 2 A

## LED-Blue-5mm-Diffused
designator LD?  value Blue-DF  Text1: 5mm  (hidden comment: LED-Blue-5mm-Diffused)
LED Blue 5mm - Diffused; Manufacturer: Various; Part Number: LED Blue 5mm - Diffused; Package: LED-5mm-Blue; EDM-PN: *; SAAB PN: *
footprint LED-5mm-Blue (LED 5mm 5.9x5.5mm)
pins: 1 K, 2 A

## LED-Blue-5mm-WW05G3SBQ4-W
designator LD?, comment value Blue  Text1: 5mm  (hidden comment: WW05G3SBQ4-W)
LED Blue 5mm 4.7mm High; Manufacturer: WAH WANG Holdings/Rabtron; EDM-PN: LED189; Part Number: WW05G3SBQ4-W; Package: LED-5x4.7mm-BLUE; SAAB PN: *
footprint LED-5x4.7mm-BLUE (LED 5mm 5.9x5.5mm 4.7mm Blue)
pins: 1 K, 2 A

## LED-Clear-3mm
designator LD?  value Clear  Text1: 3mm  (hidden comment: LED-Clear-3mm)
LED Clear 3mm; Manufacturer: Various; Part Number: LED Clear 3mm; Package: LED-3mm-Clear; EDM-PN: *; SAAB PN: *
footprint LED-3mm-Clear (LED 3mm 4.0x4.0mm Clear)
pins: 1 K, 2 A
